# Altium footprint library Connector.PcbLib: 114 footprints (part 6 of 8)
Each footprint in its own frame and in the unit in brackets; x right, y up, seen from the top. Pads: shape width x height; smd on the part's side, far side on the other; paste and mask are expansions set on the pad; w line width, h text height; cw(c..) or ccw(c..) is an arc to the next point about the centre after c.
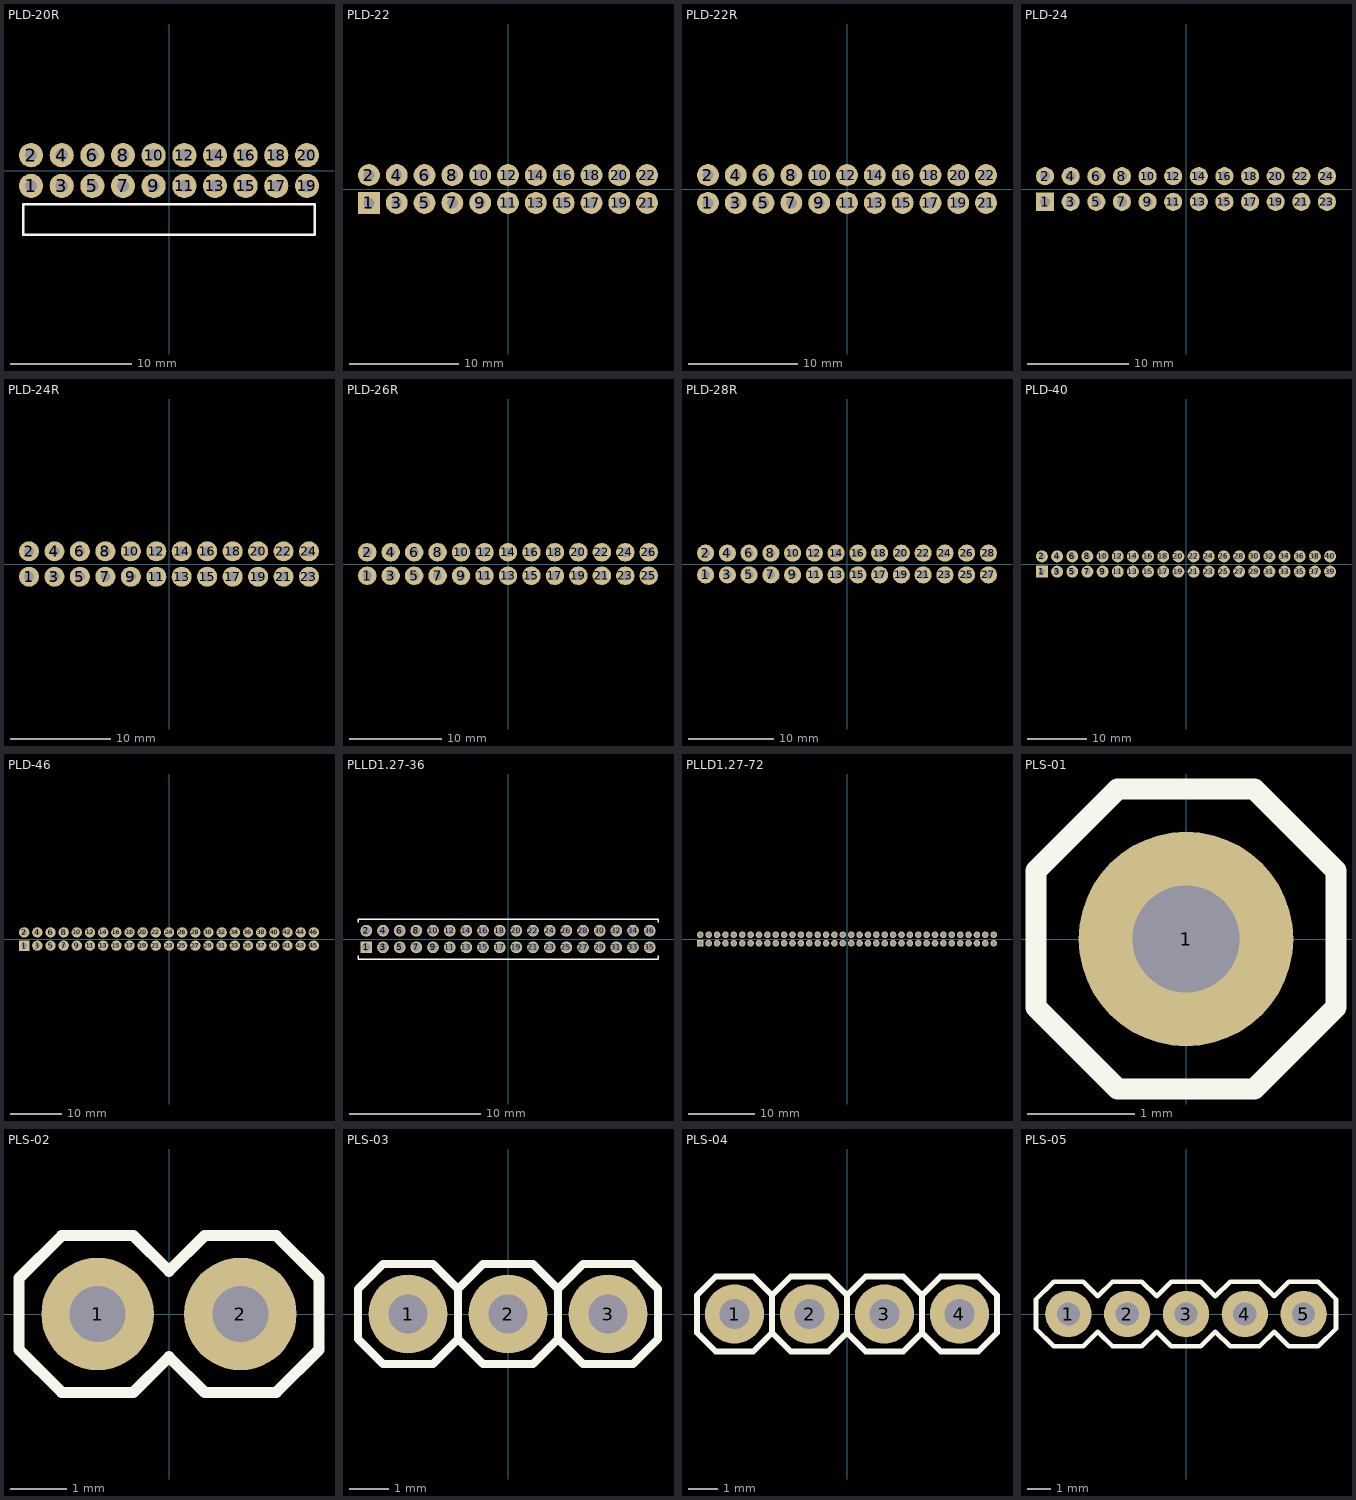
[diagram p5: the footprints below, top view; thin cyan lines are the x and y axes]

## PLD-20R [mm]
pads (20):
  round 2 hole 1: 1(-11.43,-1.27) 2(-11.43,1.27) 3(-8.89,-1.27) 4(-8.89,1.27) 5(-6.35,-1.27) 6(-6.35,1.27) 7(-3.81,-1.27) 8(-3.81,1.27) 9(-1.27,-1.27) 10(-1.27,1.27) 11(1.27,-1.27) 12(1.27,1.27) 13(3.81,-1.27) 14(3.81,1.27) 15(6.35,-1.27) 16(6.35,1.27) 17(8.89,-1.27) 18(8.89,1.27) 19(11.43,-1.27) 20(11.43,1.27)
Top Overlay:
  lines w0.2: -12.065,-5.334 -12.065,-2.794 12.065,-2.794 12.065,-5.334 -12.065,-5.334

## PLD-22 [mm]
pads (22):
  rect 2x2 hole 1: 1(-12.7,-1.27)
  round 2 hole 1: 2(-12.7,1.27) 3(-10.16,-1.27) 4(-10.16,1.27) 5(-7.62,-1.27) 6(-7.62,1.27) 7(-5.08,-1.27) 8(-5.08,1.27) 9(-2.54,-1.27) 10(-2.54,1.27) 11(0,-1.27) 12(0,1.27) 13(2.54,-1.27) 14(2.54,1.27) 15(5.08,-1.27) 16(5.08,1.27) 17(7.62,-1.27) 18(7.62,1.27) 19(10.16,-1.27) 20(10.16,1.27) 21(12.7,-1.27) 22(12.7,1.27)
3D body "PLD-xx.STEP": height 8.45, standoff -2.99, extent -13.97,-2.54 13.97,2.54

## PLD-22R [mm]
pads (22):
  round 2 hole 1 unplated: 1(-12.7,-1.27) 2(-12.7,1.27) 3(-10.16,-1.27) 4(-10.16,1.27) 5(-7.62,-1.27) 6(-7.62,1.27) 7(-5.08,-1.27) 8(-5.08,1.27) 9(-2.54,-1.27) 10(-2.54,1.27) 11(0,-1.27) 12(0,1.27) 13(2.54,-1.27) 14(2.54,1.27) 15(5.08,-1.27) 16(5.08,1.27) 17(7.62,-1.27) 18(7.62,1.27) 19(10.16,-1.27) 20(10.16,1.27) 22(12.7,1.27)
  round 2 hole 1: 21(12.7,-1.27)

## PLD-24 [mm]
pads (24):
  rect 1.8x1.8 hole 1: 1(-13.97,-1.27)
  round 1.8 hole 1: 2(-13.97,1.27) 3(-11.43,-1.27) 4(-11.43,1.27) 5(-8.89,-1.27) 6(-8.89,1.27) 7(-6.35,-1.27) 8(-6.35,1.27) 9(-3.81,-1.27) 10(-3.81,1.27) 11(-1.27,-1.27) 12(-1.27,1.27) 13(1.27,-1.27) 14(1.27,1.27) 15(3.81,-1.27) 16(3.81,1.27) 17(6.35,-1.27) 18(6.35,1.27) 19(8.89,-1.27) 20(8.89,1.27) 21(11.43,-1.27) 22(11.43,1.27) 23(13.97,-1.27) 24(13.97,1.27)
3D body "PLD-xx.STEP": height 8.45, standoff -2.99, extent -15.24,-2.54 15.24,2.54

## PLD-24R [mm]
pads (24):
  round 2 hole 1 unplated: 1(-13.97,-1.27) 2(-13.97,1.27) 3(-11.43,-1.27) 4(-11.43,1.27) 5(-8.89,-1.27) 6(-8.89,1.27) 7(-6.35,-1.27) 8(-6.35,1.27) 9(-3.81,-1.27) 10(-3.81,1.27) 11(-1.27,-1.27) 12(-1.27,1.27) 13(1.27,-1.27) 14(1.27,1.27) 15(3.81,-1.27) 16(3.81,1.27) 17(6.35,-1.27) 18(6.35,1.27) 19(8.89,-1.27) 20(8.89,1.27) 21(11.43,-1.27) 22(11.43,1.27) 24(13.97,1.27)
  round 2 hole 1: 23(13.97,-1.27)

## PLD-26R [mm]
pads (26):
  round 2 hole 1 unplated: 1(-15.24,-1.27) 2(-15.24,1.27) 3(-12.7,-1.27) 4(-12.7,1.27) 5(-10.16,-1.27) 6(-10.16,1.27) 7(-7.62,-1.27) 8(-7.62,1.27) 9(-5.08,-1.27) 10(-5.08,1.27) 11(-2.54,-1.27) 12(-2.54,1.27) 13(0,-1.27) 14(0,1.27) 15(2.54,-1.27) 16(2.54,1.27) 17(5.08,-1.27) 18(5.08,1.27) 19(7.62,-1.27) 20(7.62,1.27) 21(10.16,-1.27) 22(10.16,1.27) 23(12.7,-1.27) 24(12.7,1.27) 26(15.24,1.27)
  round 2 hole 1: 25(15.24,-1.27)

## PLD-28R [mm]
pads (28):
  round 2 hole 1 unplated: 1(-16.51,-1.27) 2(-16.51,1.27) 3(-13.97,-1.27) 4(-13.97,1.27) 5(-11.43,-1.27) 6(-11.43,1.27) 7(-8.89,-1.27) 8(-8.89,1.27) 9(-6.35,-1.27) 10(-6.35,1.27) 11(-3.81,-1.27) 12(-3.81,1.27) 13(-1.27,-1.27) 14(-1.27,1.27) 15(1.27,-1.27) 16(1.27,1.27) 17(3.81,-1.27) 18(3.81,1.27) 19(6.35,-1.27) 20(6.35,1.27) 21(8.89,-1.27) 22(8.89,1.27) 23(11.43,-1.27) 24(11.43,1.27) 25(13.97,-1.27) 26(13.97,1.27) 28(16.51,1.27)
  round 2 hole 1: 27(16.51,-1.27)

## PLD-40 [mm]
pads (40):
  rect 2x2 hole 1: 1(-24.13,-1.27)
  round 2 hole 1: 2(-24.13,1.27) 3(-21.59,-1.27) 4(-21.59,1.27) 5(-19.05,-1.27) 6(-19.05,1.27) 7(-16.51,-1.27) 8(-16.51,1.27) 9(-13.97,-1.27) 10(-13.97,1.27) 11(-11.43,-1.27) 12(-11.43,1.27) 13(-8.89,-1.27) 14(-8.89,1.27) 15(-6.35,-1.27) 16(-6.35,1.27) 17(-3.81,-1.27) 18(-3.81,1.27) 19(-1.27,-1.27) 20(-1.27,1.27) 21(1.27,-1.27) 22(1.27,1.27) 23(3.81,-1.27) 24(3.81,1.27) 25(6.35,-1.27) 26(6.35,1.27) 27(8.89,-1.27) 28(8.89,1.27) 29(11.43,-1.27) 30(11.43,1.27) 31(13.97,-1.27) 32(13.97,1.27) 33(16.51,-1.27) 34(16.51,1.27) 35(19.05,-1.27) 36(19.05,1.27) 37(21.59,-1.27) 38(21.59,1.27) 39(24.13,-1.27) 40(24.13,1.27)
3D body "PLD-40.STEP": height 8.45, standoff -2.99, extent -25.4,-2.54 25.4,2.54

## PLD-46 [mm]
pads (46):
  rect 2x2 hole 1: 1(-27.94,-1.27)
  round 2 hole 1: 2(-27.94,1.27) 3(-25.4,-1.27) 4(-25.4,1.27) 5(-22.86,-1.27) 6(-22.86,1.27) 7(-20.32,-1.27) 8(-20.32,1.27) 9(-17.78,-1.27) 10(-17.78,1.27) 11(-15.24,-1.27) 12(-15.24,1.27) 13(-12.7,-1.27) 14(-12.7,1.27) 15(-10.16,-1.27) 16(-10.16,1.27) 17(-7.62,-1.27) 18(-7.62,1.27) 19(-5.08,-1.27) 20(-5.08,1.27) 21(-2.54,-1.27) 22(-2.54,1.27) 23(0,-1.27) 24(0,1.27) 25(2.54,-1.27) 26(2.54,1.27) 27(5.08,-1.27) 28(5.08,1.27) 29(7.62,-1.27) 30(7.62,1.27) 31(10.16,-1.27) 32(10.16,1.27) 33(12.7,-1.27) 34(12.7,1.27) 35(15.24,-1.27) 36(15.24,1.27) 37(17.78,-1.27) 38(17.78,1.27) 39(20.32,-1.27) 40(20.32,1.27) 41(22.86,-1.27) 42(22.86,1.27) 43(25.4,-1.27) 44(25.4,1.27) 45(27.94,-1.27) 46(27.94,1.27)
3D body "PLD-23.STEP": height 8.45, standoff -2.99, extent -29.21,-2.54 29.21,2.54

## PLLD1.27-36 [mm]
pads (36):
  rect 0.9x0.9 hole 0.65: 1(-10.795,-0.635)
  round 0.9 hole 0.65: 2(-10.795,0.635) 3(-9.525,-0.635) 4(-9.525,0.635) 5(-8.255,-0.635) 6(-8.255,0.635) 7(-6.985,-0.635) 8(-6.985,0.635) 9(-5.715,-0.635) 10(-5.715,0.635) 11(-4.445,-0.635) 12(-4.445,0.635) 13(-3.175,-0.635) 14(-3.175,0.635) 15(-1.905,-0.635) 16(-1.905,0.635) 17(-0.635,-0.635) 18(-0.635,0.635) 19(0.635,-0.635) 20(0.635,0.635) 21(1.905,-0.635) 22(1.905,0.635) 23(3.175,-0.635) 24(3.175,0.635) 25(4.445,-0.635) 26(4.445,0.635) 27(5.715,-0.635) 28(5.715,0.635) 29(6.985,-0.635) 30(6.985,0.635) 31(8.255,-0.635) 32(8.255,0.635) 33(9.525,-0.635) 34(9.525,0.635) 35(10.795,-0.635) 36(10.795,0.635)
Top Overlay:
  lines w0.1: -11.43,-1.27 -11.43,-1.524 11.43,-1.524 11.43,-1.27 ; -11.43,1.27 -11.43,1.524 11.43,1.524 11.43,1.27
3D body "User Library-PLLD1_27-xx.step": height 4.7, standoff -2.6, extent -11.43,-1.5 11.43,1.5

## PLLD1.27-72 [mm]
pads (72):
  rect 1x1 hole 0.65 unplated: 1(-22.225,-0.635)
  round 1 hole 0.65 unplated: 2(-22.225,0.635) 3(-20.955,-0.635) 4(-20.955,0.635) 5(-19.685,-0.635) 5(12.065,-0.635) 6(-19.685,0.635) 7(-18.415,-0.635) 8(-18.415,0.635) 9(-17.145,-0.635) 10(-17.145,0.635) 11(-15.875,-0.635) 12(-15.875,0.635) 13(-14.605,-0.635) 14(-14.605,0.635) 15(-13.335,-0.635) 16(-13.335,0.635) 17(-12.065,-0.635) 18(-12.065,0.635) 19(-10.795,-0.635) 20(-10.795,0.635) 21(-9.525,-0.635) 22(-9.525,0.635) 23(-8.255,-0.635) 24(-8.255,0.635) 25(-6.985,-0.635) 26(-6.985,0.635) 27(-5.715,-0.635) 28(-5.715,0.635) 29(-4.445,-0.635) 30(-4.445,0.635) 31(-3.175,-0.635) 32(-3.175,0.635) 33(-1.905,-0.635) 34(-1.905,0.635) 35(-0.635,-0.635) 36(-0.635,0.635) 37(0.635,-0.635) 38(0.635,0.635) 39(1.905,-0.635) 40(1.905,0.635) 41(3.175,-0.635) 42(3.175,0.635) 43(4.445,-0.635) 44(4.445,0.635) 45(5.715,-0.635) 46(5.715,0.635) 47(6.985,-0.635) 48(6.985,0.635) 49(8.255,-0.635) 50(8.255,0.635) 51(9.525,-0.635) 52(9.525,0.635) 53(10.795,-0.635) 54(10.795,0.635) 56(12.065,0.635) 57(13.335,-0.635) 58(13.335,0.635) 59(14.605,-0.635) 60(14.605,0.635) 61(15.875,-0.635) 62(15.875,0.635) 63(17.145,-0.635) 64(17.145,0.635) 65(18.415,-0.635) 66(18.415,0.635) 67(19.685,-0.635) 68(19.685,0.635) 69(20.955,-0.635) 70(20.955,0.635) 71(22.225,-0.635) 72(22.225,0.635)

## PLS-01 [mm]
pads (1):
  round 2 hole 1: 1(0,0)
Top Overlay:
  lines w0.2: -1.397,-0.635 -0.635,-1.397 0.635,-1.397 1.397,-0.635 1.397,0.635 0.635,1.397 -0.635,1.397 -1.397,0.635 -1.397,-0.635
3D body "PLS-xx.STEP": height 8.45, standoff -2.99, extent -1.27,-1.27 1.27,1.27

## PLS-02 [mm]
pads (2):
  round 2 hole 1: 1(-1.27,0) 2(1.27,0)
Top Overlay:
  lines w0.2: -2.667,-0.635 -2.667,0.635 -1.905,1.397 -0.635,1.397 0,0.762 0.635,1.397 1.905,1.397 2.667,0.635 2.667,-0.635 1.905,-1.397 0.635,-1.397 0,-0.762 -0.635,-1.397 -1.905,-1.397 -2.667,-0.635
3D body "pls2.STEP": height 8.45, standoff -2.99, extent -2.54,-1.27 2.54,1.27

## PLS-03 [mm]
pads (3):
  round 2 hole 1: 1(-2.54,0) 2(0,0) 3(2.54,0)
Top Overlay:
  lines w0.2: -1.27,-0.635 -0.635,-1.27 0.635,-1.27 1.27,-0.635 ; -1.27,-0.635 -1.27,0.635 ; -1.27,-0.635 -1.905,-1.27 -3.175,-1.27 -3.81,-0.635 -3.81,0.635 -3.175,1.27 -1.905,1.27 -1.27,0.635 ; -1.27,0.635 -0.635,1.27 0.635,1.27 1.27,0.635 ; 1.27,-0.635 1.905,-1.27 3.175,-1.27 3.81,-0.635 3.81,0.635 3.175,1.27 1.905,1.27 1.27,0.635 ; 1.27,-0.635 1.27,0.635

## PLS-04 [mm]
pads (4):
  round 2 hole 1: 1(-3.81,0) 2(-1.27,0) 3(1.27,0) 4(3.81,0)
Top Overlay:
  lines w0.2: -2.54,-0.635 -3.175,-1.27 -4.445,-1.27 -5.08,-0.635 -5.08,0.635 -4.445,1.27 -3.175,1.27 -2.54,0.635 ; -2.54,-0.635 -2.54,0.635 ; -2.54,-0.635 -1.905,-1.27 -0.635,-1.27 0,-0.635 ; -2.54,0.635 -1.905,1.27 -0.635,1.27 0,0.635 ; 0,-0.635 0,0.635 ; 0,-0.635 0.635,-1.27 1.905,-1.27 2.54,-0.635 ; 0,0.635 0.635,1.27 1.905,1.27 2.54,0.635 ; 2.54,-0.635 2.54,0.635 ; 2.54,-0.635 3.175,-1.27 4.445,-1.27 5.08,-0.635 5.08,0.635 4.445,1.27 3.175,1.27 2.54,0.635
3D body "pls4.STEP": height 8.45, standoff -2.99, extent -5.08,-1.27 5.08,1.27

## PLS-05 [mm]
pads (5):
  round 2 hole 1: 1(-5.08,0) 2(-2.54,0) 3(0,0) 4(2.54,0) 5(5.08,0)
Top Overlay:
  lines w0.2: -6.477,-0.635 -5.715,-1.397 -4.445,-1.397 -3.81,-0.762 -3.175,-1.397 -1.905,-1.397 -1.27,-0.762 -0.635,-1.397 0.635,-1.397 1.27,-0.762 1.905,-1.397 3.175,-1.397 3.81,-0.762 4.445,-1.397 5.715,-1.397 6.477,-0.635 6.477,0.635 5.715,1.397 4.445,1.397 3.81,0.762 3.175,1.397 1.905,1.397 1.27,0.762 0.635,1.397 -0.635,1.397 -1.27,0.762 -1.905,1.397 -3.175,1.397 -3.81,0.762 -4.445,1.397 -5.715,1.397 -6.477,0.635 -6.477,-0.635
3D body "PLS-05.STEP": height 8.45, standoff -2.99, extent -6.35,-1.27 6.35,1.27